# Altium footprint library microbuilder.PCBLIB: 422 footprints (part 27 of 27)
Each footprint in its own frame and in the unit in brackets; x right, y up, seen from the top. Pads: shape width x height; smd on the part's side, far side on the other; paste and mask are expansions set on the pad; w line width, h text height; cw(c..) or ccw(c..) is an arc to the next point about the centre after c.
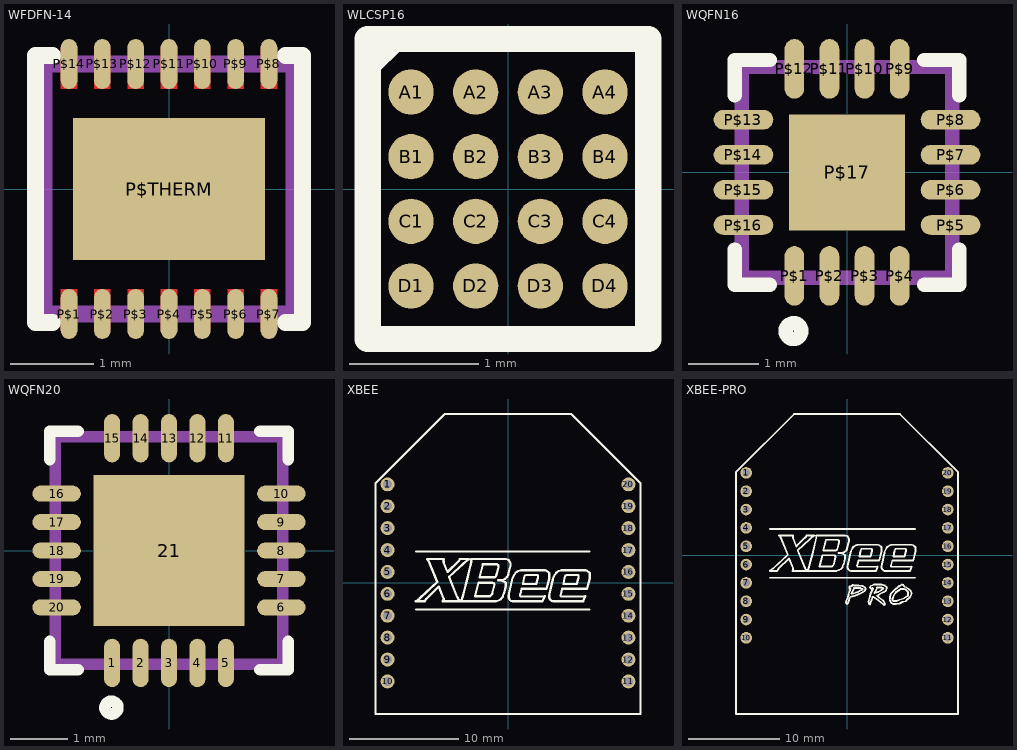
[diagram p26: the footprints below, top view; thin cyan lines are the x and y axes]

## WFDFN-14 [mil]
pads (15):
  rrect100% 7.87x23.62 smd: P$1(-47.24,-59.06) P$2(-31.5,-59.06) P$3(-15.75,-59.06) P$4(0,-59.06) P$5(15.75,-59.06) P$6(31.5,-59.06) P$7(47.24,-59.06) P$8(47.24,59.06) P$9(31.5,59.06) P$10(15.75,59.06) P$11(0,59.06) P$12(-15.75,59.06) P$13(-31.5,59.06) P$14(-47.24,59.06)
  rect 90.55x66.93 smd: P$THERM(0,0)
Top Layer:
  rectangle: -51.18,-66.93 -43.31,-47.24
  rectangle: -35.43,-66.93 -27.56,-47.24
  rectangle: -19.69,-66.93 -11.81,-47.24
  rectangle: -3.94,-66.93 3.94,-47.24
  rectangle: 11.81,-66.93 19.69,-47.24
  rectangle: 27.56,-66.93 35.43,-47.24
  rectangle: 43.31,-66.93 51.18,-47.24
  rectangle: -51.18,47.24 -43.31,66.93
  rectangle: -35.43,47.24 -27.56,66.93
  rectangle: -19.69,47.24 -11.81,66.93
  rectangle: -3.94,47.24 3.94,66.93
  rectangle: 11.81,47.24 19.69,66.93
  rectangle: 27.56,47.24 35.43,66.93
  rectangle: 43.31,47.24 51.18,66.93
Top Overlay:
  lines w8: -55.12,-62.99 -62.99,-62.99 -62.99,62.99 -55.12,62.99 ; 55.12,-62.99 62.99,-62.99 62.99,62.99 55.12,62.99
Mechanical 16:
  lines w8: -59.06,-59.06 59.06,-59.06 59.06,59.06 -59.06,59.06 -59.06,-59.06

## WLCSP16 [mm]
pads (16):
  rrect100% 0.35x0.35 smd: A1(-0.75,0.75) A2(-0.25,0.75) A3(0.25,0.75) A4(0.75,0.75) B1(-0.75,0.25) B2(-0.25,0.25) B3(0.25,0.25) B4(0.75,0.25) C1(-0.75,-0.25) C2(-0.25,-0.25) C3(0.25,-0.25) C4(0.75,-0.25) D1(-0.75,-0.75) D2(-0.25,-0.75) D3(0.25,-0.75) D4(0.75,-0.75)
Top Overlay:
  lines w0.203: -1.085,0.96 -1.085,-1.16 1.085,-1.16 1.085,1.16 -0.885,1.16 ; -1.085,0.96 -1.085,1.16 -0.885,1.16 ; -1.085,0.96 -0.885,1.16
Top Solder:
  circle w0: c-0.75,0.75 r0.2
  circle w0: c-0.75,0.25 r0.2
  circle w0: c-0.75,-0.25 r0.2
  circle w0: c-0.75,-0.75 r0.2
  circle w0: c-0.25,0.75 r0.2
  circle w0: c-0.25,0.25 r0.2
  circle w0: c-0.25,-0.25 r0.2
  circle w0: c-0.25,-0.75 r0.2
  circle w0: c0.25,0.75 r0.2
  circle w0: c0.25,0.25 r0.2
  circle w0: c0.25,-0.25 r0.2
  circle w0: c0.25,-0.75 r0.2
  circle w0: c0.75,0.75 r0.2
  circle w0: c0.75,0.25 r0.2
  circle w0: c0.75,-0.25 r0.2
  circle w0: c0.75,-0.75 r0.2

## WQFN16 [mm]
pads (17):
  rrect100% 0.28x0.85 smd: P$1(-0.75,-1.475) P$2(-0.25,-1.475) P$3(0.25,-1.475) P$4(0.75,-1.475) P$9(0.75,1.475) P$10(0.25,1.475) P$11(-0.25,1.475) P$12(-0.75,1.475)
  rrect100% 0.85x0.28 smd: P$5(1.475,-0.75) P$6(1.475,-0.25) P$7(1.475,0.25) P$8(1.475,0.75) P$13(-1.475,0.75) P$14(-1.475,0.25) P$15(-1.475,-0.25) P$16(-1.475,-0.75)
  rect 1.65x1.65 smd: P$17(0,0)
Top Overlay:
  circle w0.203: c-0.762,-2.261 r0.114
  lines w0.203: -1.6,-1.1 -1.6,-1.6 -1.1,-1.6 ; -1.6,1.1 -1.6,1.6 -1.1,1.6 ; 1.1,-1.6 1.6,-1.6 1.6,-1.1 ; 1.1,1.6 1.6,1.6 1.6,1.1
Top Paste:
  rectangle: -0.8,0.1 -0.1,0.8
  rectangle: 0.1,0.1 0.8,0.8
  rectangle: -0.8,-0.8 -0.1,-0.1
  rectangle: 0.1,-0.8 0.8,-0.1
Mechanical 16:
  lines w0.203: -1.5,-1.5 1.5,-1.5 1.5,1.5 -1.5,1.5 -1.5,-1.5

## WQFN20 [mm]
pads (21):
  rrect100% 0.28x0.85 smd: 1(-1,-1.975) 2(-0.5,-1.975) 3(0,-1.975) 4(0.5,-1.975) 5(1,-1.975) 11(1,1.975) 12(0.5,1.975) 13(0,1.975) 14(-0.5,1.975) 15(-1,1.975)
  rrect100% 0.85x0.28 smd: 6(1.975,-1) 7(1.975,-0.5) 8(1.975,0) 9(1.975,0.5) 10(1.975,1) 16(-1.975,1) 17(-1.975,0.5) 18(-1.975,0) 19(-1.975,-0.5) 20(-1.975,-1)
  rect 2.65x2.65 smd: 21(0,0)
Top Overlay:
  circle w0.203: c-1.012,-2.761 r0.114
  lines w0.203: -2.1,-1.6 -2.1,-2.1 -1.6,-2.1 ; -2.1,1.6 -2.1,2.1 -1.6,2.1 ; 1.6,-2.1 2.1,-2.1 2.1,-1.6 ; 1.6,2.1 2.1,2.1 2.1,1.6
Top Paste:
  rectangle: -1.25,0.15 -0.15,1.25
  rectangle: 0.15,0.15 1.25,1.25
  rectangle: 0.15,-1.25 1.25,-0.15
  rectangle: -1.25,-1.25 -0.15,-0.15
Mechanical 16:
  lines w0.203: -2,-2 2,-2 2,2 -2,2 -2,-2

## XBEE [mm]
pads (20):
  round 1.27 hole 0.8: 1(-11,9) 2(-11,7) 3(-11,5) 4(-11,3) 5(-11,1) 6(-11,-1) 7(-11,-3) 8(-11,-5) 9(-11,-7) 10(-11,-9) 11(11,-9) 12(11,-7) 13(11,-5) 14(11,-3) 15(11,-1) 16(11,1) 17(11,3) 18(11,5) 19(11,7) 20(11,9)
Top Overlay:
  drawing of 163 lines, arcs and shapes, not listed

## XBEE-PRO [mm]
pads (20):
  round 1.27 hole 0.8: 1(-11,9) 2(-11,7) 3(-11,5) 4(-11,3) 5(-11,1) 6(-11,-1) 7(-11,-3) 8(-11,-5) 9(-11,-7) 10(-11,-9) 11(11,-9) 12(11,-7) 13(11,-5) 14(11,-3) 15(11,-1) 16(11,1) 17(11,3) 18(11,5) 19(11,7) 20(11,9)
Top Overlay:
  drawing of 309 lines, arcs and shapes, not listed